# Altium footprint library Conectores GAM.PcbLib: 182 footprints (part 2 of 12)
Each footprint in its own frame and in the unit in brackets; x right, y up, seen from the top. Pads: shape width x height; smd on the part's side, far side on the other; paste and mask are expansions set on the pad; w line width, h text height; cw(c..) or ccw(c..) is an arc to the next point about the centre after c.
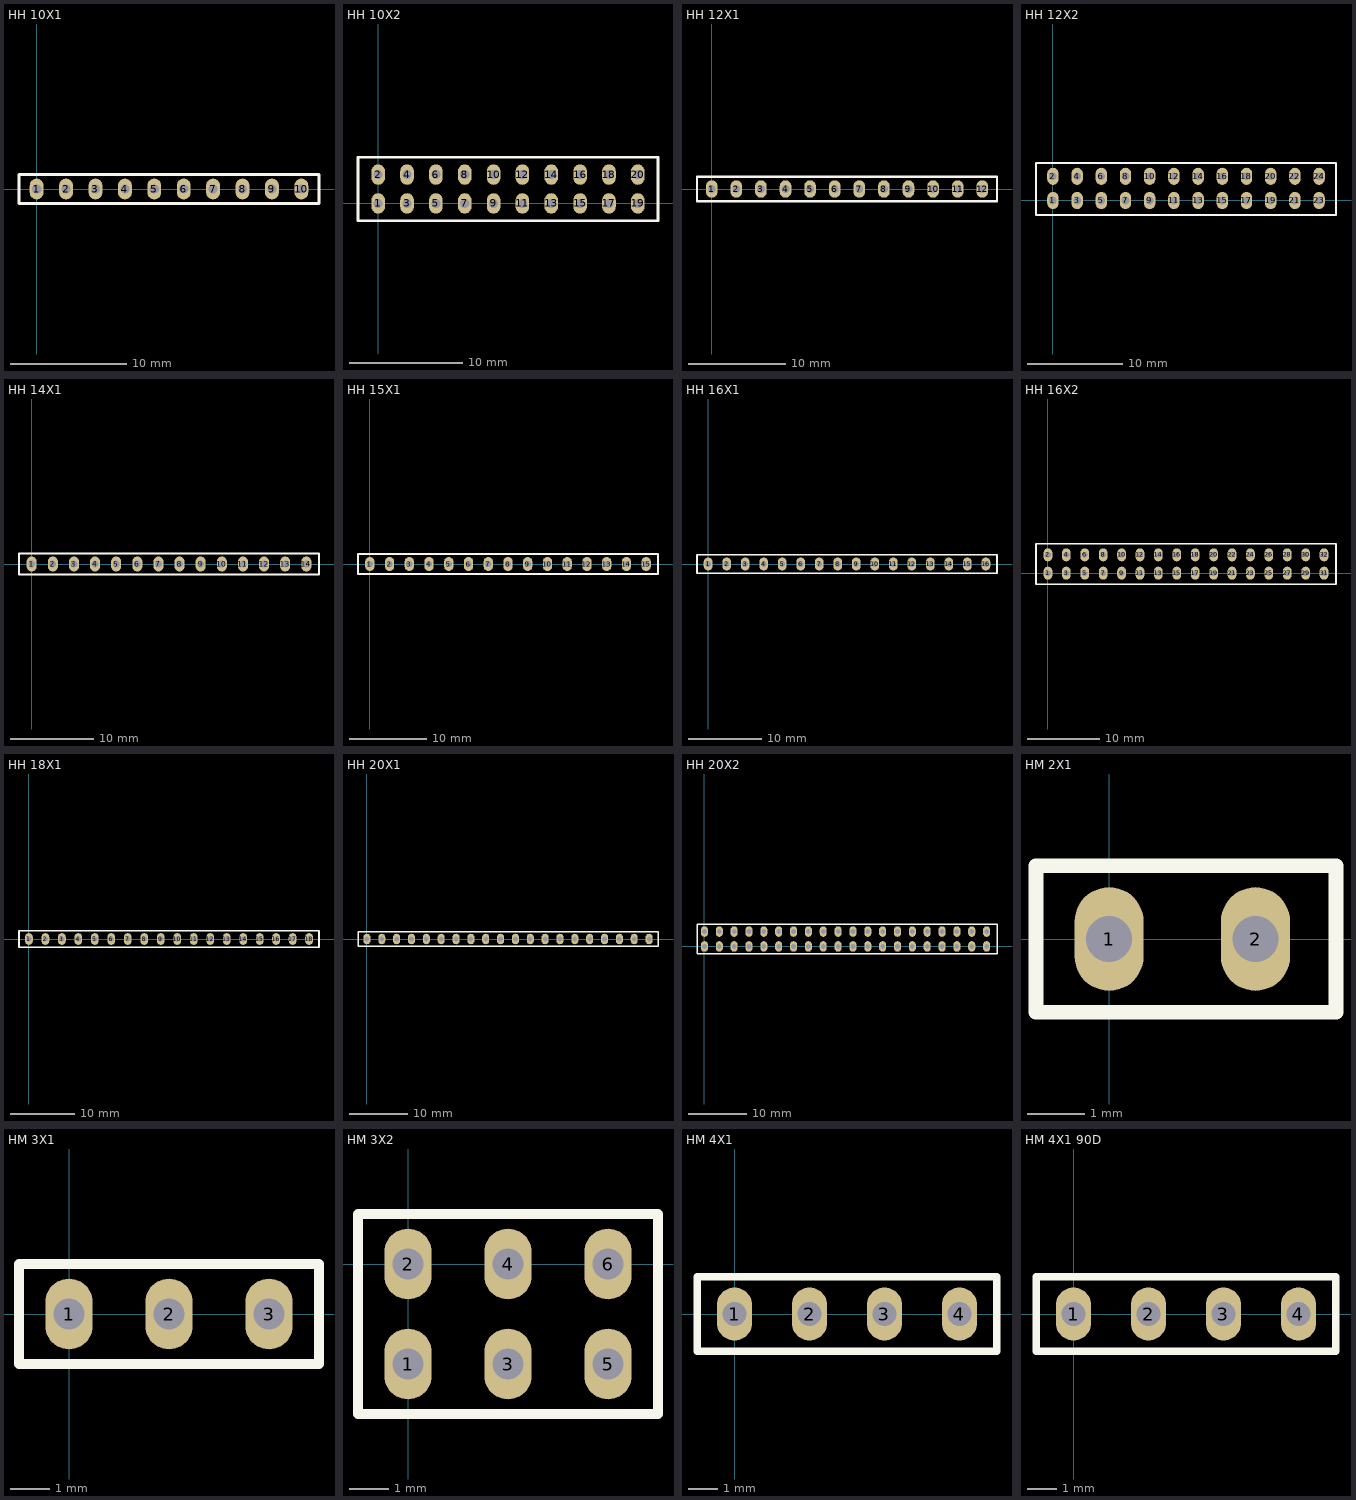
[diagram p1: the footprints below, top view; thin cyan lines are the x and y axes]

## HH 10X1 [mm] "Header Hembra 10x1 2.54mm"
pads (10):
  oval 1.2x1.8 hole 0.8: 1(0,0) 2(2.54,0) 3(5.08,0) 4(7.62,0) 5(10.16,0) 6(12.7,0) 7(15.24,0) 8(17.78,0) 9(20.32,0) 10(22.86,0)
Top Overlay:
  lines w0.254: -1.524,-1.27 -1.524,1.27 24.384,1.27 24.384,-1.27 -1.524,-1.27
3D body "HH10X1.stp": height 9, standoff -2.7, extent -1.397,-1.25 24.253,1.25

## HH 10X2 [mm] "Header Hembra 10x2 2.54mm"
pads (20):
  oval 1.2x1.8 hole 0.8: 1(0,0) 2(0,2.54) 3(2.54,0) 4(2.54,2.54) 5(5.08,0) 6(5.08,2.54) 7(7.62,0) 8(7.62,2.54) 9(10.16,0) 10(10.16,2.54) 11(12.7,0) 12(12.7,2.54) 13(15.24,0) 14(15.24,2.54) 15(17.78,0) 16(17.78,2.54) 17(20.32,0) 18(20.32,2.54) 19(22.86,0) 20(22.86,2.54)
Top Overlay:
  lines w0.254: -1.778,-1.524 24.638,-1.524 24.638,4.064 -1.778,4.064 -1.778,-1.524
3D body "20-Pin Header - Female - Double - 2.54mm.step": height 9, standoff -2.5, extent -1.516,-1.23 24.384,3.77

## HH 12X1 [mm] "Header Hembra 12x1 2.54mm"
pads (12):
  oval 1.2x1.8 hole 0.8: 1(0,0) 2(2.54,0) 3(5.08,0) 4(7.62,0) 5(10.16,0) 6(12.7,0) 7(15.24,0) 8(17.78,0) 9(20.32,0) 10(22.86,0) 11(25.4,0) 12(27.94,0)
Top Overlay:
  lines w0.254: -1.524,-1.27 -1.524,1.27 29.464,1.27 29.464,-1.27 -1.524,-1.27
3D body "HH12X1.stp": height 9, standoff -2.7, extent -1.397,-1.25 29.333,1.25

## HH 12X2 [mm] "Header Hembra 12x2 2.54mm"
pads (24):
  oval 1.2x1.8 hole 0.8: 1(0,0) 2(0,2.54) 3(2.54,0) 4(2.54,2.54) 5(5.08,0) 6(5.08,2.54) 7(7.62,0) 8(7.62,2.54) 9(10.16,0) 10(10.16,2.54) 11(12.7,0) 12(12.7,2.54) 13(15.24,0) 14(15.24,2.54) 15(17.78,0) 16(17.78,2.54) 17(20.32,0) 18(20.32,2.54) 19(22.86,0) 20(22.86,2.54) 21(25.4,0) 22(25.4,2.54) 23(27.94,0) 24(27.94,2.54)
Top Overlay:
  lines w0.254: -1.778,-1.524 29.718,-1.524 29.718,3.937 -1.778,3.937 -1.778,-1.524
3D body "24-Pin Header - Female - Double - 2.54mm.step": height 9, standoff -2.5, extent -1.52,-1.259 29.46,3.741

## HH 14X1 [mm] "Header Hembra 14x1 2.54mm"
pads (14):
  oval 1.2x1.8 hole 0.8: 1(0,0) 2(2.54,0) 3(5.08,0) 4(7.62,0) 5(10.16,0) 6(12.7,0) 7(15.24,0) 8(17.78,0) 9(20.32,0) 10(22.86,0) 11(25.4,0) 12(27.94,0) 13(30.48,0) 14(33.02,0)
Top Overlay:
  lines w0.254: -1.524,-1.27 34.544,-1.27 34.544,1.27 -1.524,1.27 -1.524,-1.27
3D body "HH14X1.stp": height 9, standoff -2.7, extent -1.397,-1.25 34.413,1.25

## HH 15X1 [mm] "Header Hembra 15x1 2.54mm"
pads (15):
  oval 1.2x1.8 hole 0.8: 1(0,0) 2(2.54,0) 3(5.08,0) 4(7.62,0) 5(10.16,0) 6(12.7,0) 7(15.24,0) 8(17.78,0) 9(20.32,0) 10(22.86,0) 11(25.4,0) 12(27.94,0) 13(30.48,0) 14(33.02,0) 15(35.56,0)
Top Overlay:
  lines w0.254: -1.524,-1.27 -1.524,1.27 37.084,1.27 37.084,-1.27 -1.524,-1.27
3D body "HH15X1.stp": height 9, standoff -2.7, extent -1.397,-1.25 36.953,1.25

## HH 16X1 [mm] "Header Hembra 16x1 2.54mm"
pads (16):
  oval 1.2x1.8 hole 0.8: 1(0,0) 2(2.54,0) 3(5.08,0) 4(7.62,0) 5(10.16,0) 6(12.7,0) 7(15.24,0) 8(17.78,0) 9(20.32,0) 10(22.86,0) 11(25.4,0) 12(27.94,0) 13(30.48,0) 14(33.02,0) 15(35.56,0) 16(38.1,0)
Top Overlay:
  lines w0.254: -1.524,-1.27 -1.524,1.27 39.624,1.27 39.624,-1.27 -1.524,-1.27
3D body "HH16X1.stp": height 9, standoff -2.7, extent -1.397,-1.25 39.493,1.25

## HH 16X2 [mm] "Header Hembra 16x2 2.54mm"
pads (32):
  oval 1.2x1.8 hole 0.8: 1(0,0) 2(0,2.54) 3(2.54,0) 4(2.54,2.54) 5(5.08,0) 6(5.08,2.54) 7(7.62,0) 8(7.62,2.54) 9(10.16,0) 10(10.16,2.54) 11(12.7,0) 12(12.7,2.54) 13(15.24,0) 14(15.24,2.54) 15(17.78,0) 16(17.78,2.54) 17(20.32,0) 18(20.32,2.54) 19(22.86,0) 20(22.86,2.54) 21(25.4,0) 22(25.4,2.54) 23(27.94,0) 24(27.94,2.54) 25(30.48,0) 26(30.48,2.54) 27(33.02,0) 28(33.02,2.54) 29(35.56,0) 30(35.56,2.54) 31(38.1,0) 32(38.1,2.54)
Top Overlay:
  lines w0.254: -1.651,-1.524 39.751,-1.524 39.751,4.064 -1.651,4.064 -1.651,-1.524
3D body "FH16X2.stp": height 8.95, standoff -2.75, extent -1.397,-1.23 39.493,3.77

## HH 18X1 [mm] "Header Hembra 18x1 2.54mm"
pads (18):
  oval 1.2x1.8 hole 0.8: 1(0,0) 2(2.54,0) 3(5.08,0) 4(7.62,0) 5(10.16,0) 6(12.7,0) 7(15.24,0) 8(17.78,0) 9(20.32,0) 10(22.86,0) 11(25.4,0) 12(27.94,0) 13(30.48,0) 14(33.02,0) 15(35.56,0) 16(38.1,0) 17(40.64,0) 18(43.18,0)
Top Overlay:
  lines w0.254: -1.524,-1.27 -1.524,1.27 44.704,1.27 44.704,-1.27 -1.524,-1.27
3D body "HH18X1.stp": height 9, standoff -2.7, extent -1.397,-1.25 44.573,1.25

## HH 20X1 [mm] "Header Hembra 20x1 2.54mm"
pads (20):
  oval 1.2x1.8 hole 0.8: 1(0,0) 2(2.54,0) 3(5.08,0) 4(7.62,0) 5(10.16,0) 6(12.7,0) 7(15.24,0) 8(17.78,0) 9(20.32,0) 10(22.86,0) 11(25.4,0) 12(27.94,0) 13(30.48,0) 14(33.02,0) 15(35.56,0) 16(38.1,0) 17(40.64,0) 18(43.18,0) 19(45.72,0) 20(48.26,0)
Top Overlay:
  lines w0.254: -1.524,-1.27 -1.524,1.27 49.784,1.27 49.784,-1.27 -1.524,-1.27
3D body "HH20X1.stp": height 9, standoff -2.7, extent -1.397,-1.25 49.653,1.25

## HH 20X2 [mm] "Header Hembra 20x2 2.54mm"
pads (40):
  oval 1.2x1.8 hole 0.8: 1(0,0) 2(0,2.54) 3(2.54,0) 4(2.54,2.54) 5(5.08,0) 6(5.08,2.54) 7(7.62,0) 8(7.62,2.54) 9(10.16,0) 10(10.16,2.54) 11(12.7,0) 12(12.7,2.54) 13(15.24,0) 14(15.24,2.54) 15(17.78,0) 16(17.78,2.54) 17(20.32,0) 18(20.32,2.54) 19(22.86,0) 20(22.86,2.54) 21(25.4,0) 22(25.4,2.54) 23(27.94,0) 24(27.94,2.54) 25(30.48,0) 26(30.48,2.54) 27(33.02,0) 28(33.02,2.54) 29(35.56,0) 30(35.56,2.54) 31(38.1,0) 32(38.1,2.54) 33(40.64,0) 34(40.64,2.54) 35(43.18,0) 36(43.18,2.54) 37(45.72,0) 38(45.72,2.54) 39(48.26,0) 40(48.26,2.54)
Top Overlay:
  lines w0.254: -1.27,-1.27 -1.27,1.27 -1.27,3.81 50.038,3.81 50.038,-1.27 -1.27,-1.27
3D body "FH20X2.stp": height 9, standoff -2.7, extent -1.397,-1.23 49.653,3.77

## HM 2X1 [mm] "Header Macho 2x1 2.54mm"
pads (2):
  oval 1.2x1.8 hole 0.8: 1(0,0) 2(2.54,0)
Top Overlay:
  lines w0.254: -1.27,-1.27 -1.27,1.27 3.937,1.27 3.937,-1.27 -1.27,-1.27
3D body "Header_Male_1Pin.STEP": height 8.54, standoff -3, extent -1.27,-1.245 1.27,1.245
3D body "Header_Male_1Pin.STEP": height 8.54, standoff -3, extent 1.27,-1.245 3.81,1.245

## HM 3X1 [mm] "Header Macho 3x1 2.54mm"
pads (3):
  oval 1.2x1.8 hole 0.8: 1(0,0) 2(2.54,0) 3(5.08,0)
Top Overlay:
  lines w0.254: -1.27,-1.27 -1.27,1.27 6.35,1.27 6.35,-1.27 -1.27,-1.27
3D body "Header_Male_1Pin.STEP": height 8.54, standoff -3, extent -1.27,-1.245 1.27,1.245
3D body "Header_Male_1Pin.STEP": height 8.54, standoff -3, extent 1.27,-1.245 3.81,1.245
3D body "Header_Male_1Pin.STEP": height 8.54, standoff -3, extent 3.81,-1.245 6.35,1.245

## HM 3X2 [mm] "Header Macho 3x2 2.54mm"
pads (6):
  oval 1.2x1.8 hole 0.8: 1(0,-2.54) 2(0,0) 3(2.54,-2.54) 4(2.54,0) 5(5.08,-2.54) 6(5.08,0)
Top Overlay:
  lines w0.254: -1.27,-3.81 6.35,-3.81 6.35,1.27 -1.27,1.27 -1.27,-3.81
3D body "Header_Male_1Pin.STEP": height 8.54, standoff -3, extent 3.81,-1.245 6.35,1.245
3D body "Header_Male_1Pin.STEP": height 8.54, standoff -3, extent 1.27,-1.245 3.81,1.245
3D body "Header_Male_1Pin.STEP": height 8.54, standoff -3, extent -1.27,-1.245 1.27,1.245
3D body "Header_Male_1Pin.STEP": height 8.54, standoff -3, extent -1.27,-3.785 1.27,-1.295
3D body "Header_Male_1Pin.STEP": height 8.54, standoff -3, extent 1.27,-3.785 3.81,-1.295
3D body "Header_Male_1Pin.STEP": height 8.54, standoff -3, extent 3.81,-3.785 6.35,-1.295

## HM 4X1 [mm] "Header Macho 4x1 2.54mm"
pads (4):
  oval 1.2x1.8 hole 0.8: 1(0,0) 2(2.54,0) 3(5.08,0) 4(7.62,0)
Top Overlay:
  lines w0.254: -1.27,-1.27 8.89,-1.27 8.89,1.27 -1.27,1.27 -1.27,-1.27
3D body "Header_Male_1Pin.STEP": height 8.54, standoff -3, extent 6.35,-1.245 8.89,1.245
3D body "Header_Male_1Pin.STEP": height 8.54, standoff -3, extent 3.81,-1.245 6.35,1.245
3D body "Header_Male_1Pin.STEP": height 8.54, standoff -3, extent 1.27,-1.245 3.81,1.245
3D body "Header_Male_1Pin.STEP": height 8.54, standoff -3, extent -1.27,-1.245 1.27,1.245

## HM 4X1 90D [mm] "Header Macho 4x1 2.54mm Angulo"
pads (4):
  oval 1.2x1.8 hole 0.8: 1(0,0) 2(2.54,0) 3(5.08,0) 4(7.62,0)
Top Overlay:
  lines w0.254: -1.27,-1.27 8.89,-1.27 8.89,1.27 -1.27,1.27 -1.27,-1.27
3D body "Header_Male_1Pin.STEP": height 8.54, standoff -3, extent 6.35,-1.245 8.89,1.245
3D body "Header_Male_1Pin.STEP": height 8.54, standoff -3, extent 3.81,-1.245 6.35,1.245
3D body "Header_Male_1Pin.STEP": height 8.54, standoff -3, extent 1.27,-1.245 3.81,1.245
3D body "Header_Male_1Pin.STEP": height 8.54, standoff -3, extent -1.27,-1.245 1.27,1.245